# Altium footprint library u025Library.PcbLib: 144 footprints (part 3 of 9)
Each footprint in its own frame and in the unit in brackets; x right, y up, seen from the top. Pads: shape width x height; smd on the part's side, far side on the other; paste and mask are expansions set on the pad; w line width, h text height; cw(c..) or ccw(c..) is an arc to the next point about the centre after c.
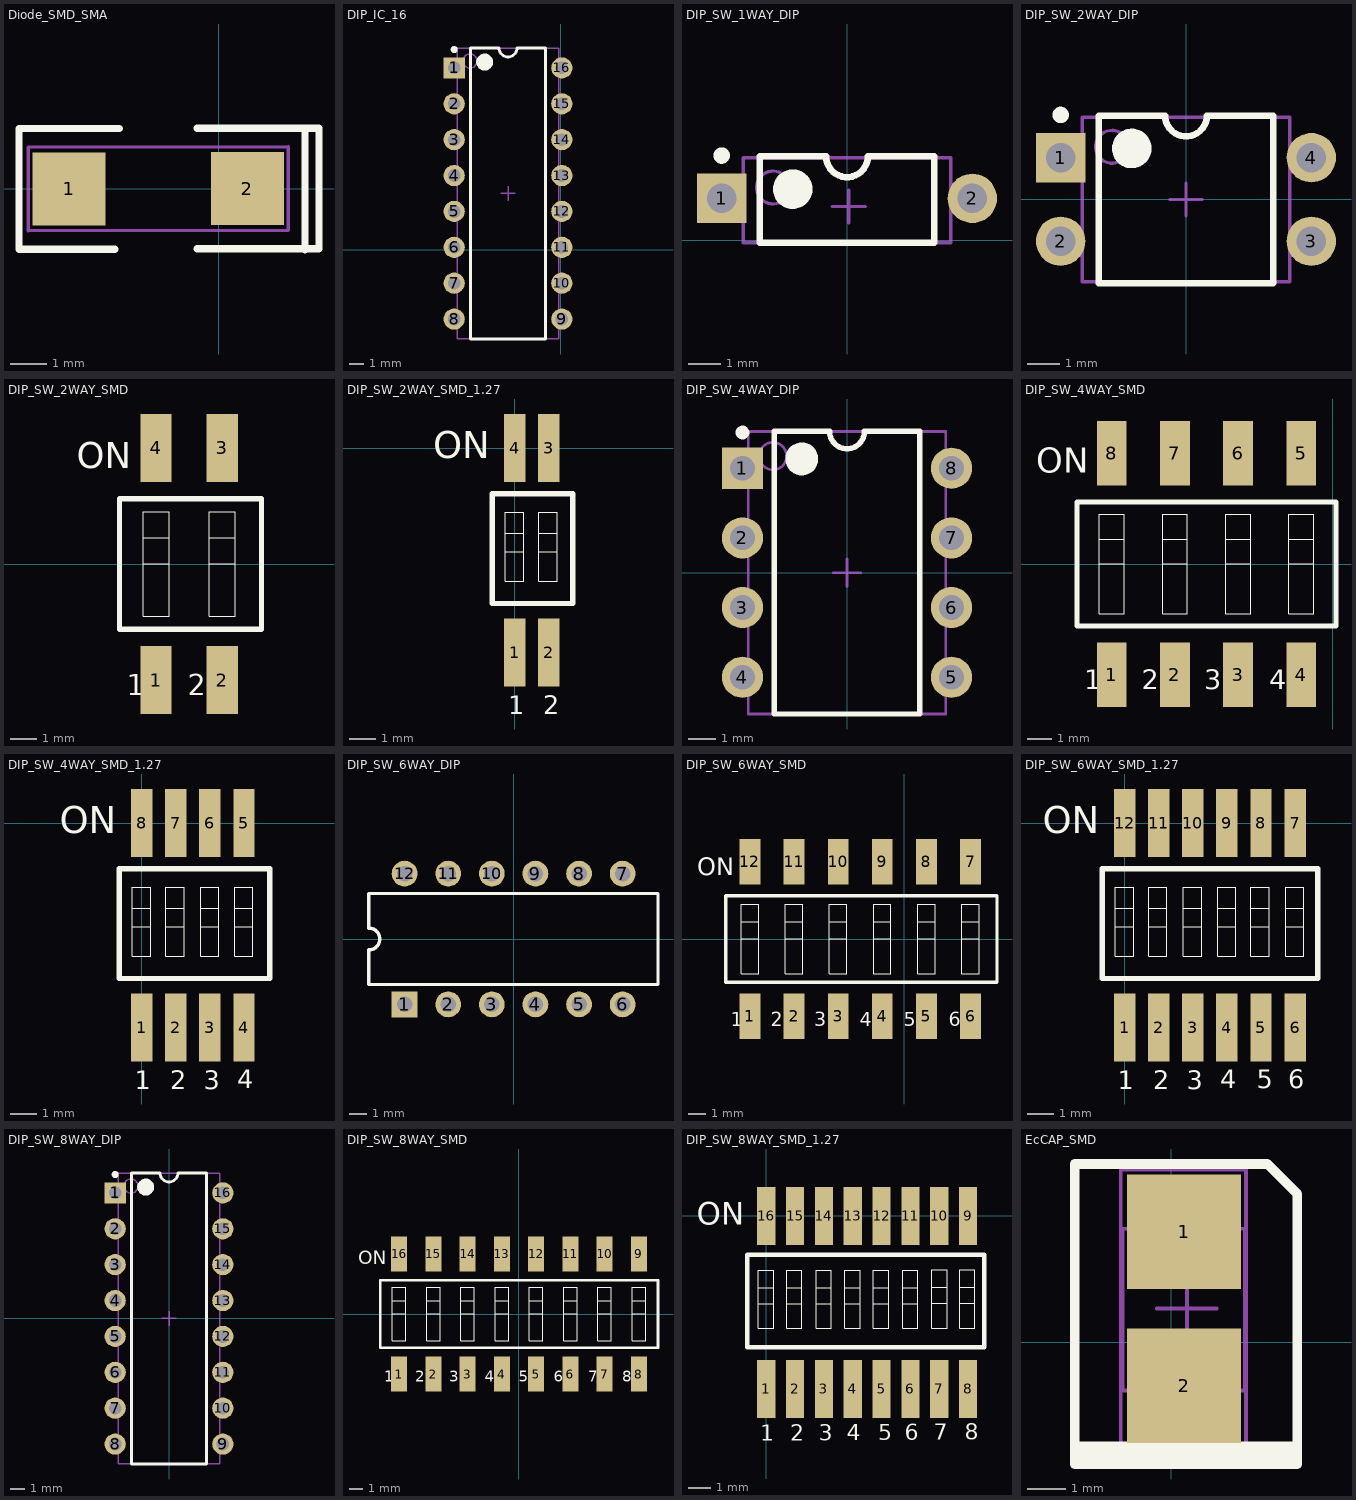
[diagram p2: the footprints below, top view; thin cyan lines are the x and y axes]

## Diode_SMD_SMA [mm] "Diode_SMD_SMA"
height 2.3
pads (2):
  rect 2x2 smd: 1(-4.09,0) 2(0.788,0.011)
Top Overlay:
  lines w0.2: -2.845,-1.651 -5.461,-1.651 -5.461,1.651 -2.718,1.651 ; -0.583,-1.64 2.744,-1.64 2.744,1.662 -0.583,1.662 ; 2.363,-1.666 2.363,1.636
Mechanical 15:
  lines w0.1: -5.207,-1.144 1.906,-1.132 1.906,1.154 -5.207,1.142 ; -5.207,-1.143 -5.207,1.143
3D body: height 2.5, standoff 0.1, extent -4.276,-1.275 0.924,1.325

## DIP_IC_16 [mm]
pads (16):
  rect 1.5x1.5 hole 0.9: 1(-7.552,12.876)
  round 1.5 hole 0.9: 2(-7.552,10.336) 3(-7.552,7.796) 4(-7.552,5.256) 5(-7.552,2.716) 6(-7.552,0.176) 7(-7.552,-2.364) 8(-7.552,-4.904) 9(0.068,-4.904) 10(0.068,-2.364) 11(0.068,0.176) 12(0.068,2.716) 13(0.068,5.256) 14(0.068,7.796) 15(0.068,10.336) 16(0.068,12.876)
Top Overlay:
  circle w0.6: c-5.392,13.286 r0.3
  circle w0.25: c-7.552,14.176 r0.125
  lines w0.2: -6.392,-6.314 -1.092,-6.314 -1.092,14.286 -3.107,14.286 cw(c-3.742,14.286) -4.377,14.286 -6.392,14.286 -6.392,-6.314
Mechanical 13:
  circle w0.1: c-6.442,13.361 r0.5
  lines w0.1: -7.342,-6.289 -0.142,-6.289 -0.142,14.261 -7.342,14.261 -7.342,-6.289
Mechanical 15:
  lines w0.1: -4.242,3.986 -3.242,3.986 ; -3.742,3.486 -3.742,4.486
3D body: height 3.3, standoff -0.9, extent -7.45,-6.199 0.17,14.121

## DIP_SW_1WAY_DIP [mm] "DIP; 2 Leads; Row Spacing 7.62 mm; Pitch 2.54 mm"
height 5.6
pads (2):
  rect 1.5x1.5 hole 0.9: 1(-3.81,1.27)
  round 1.5 hole 0.9: 2(3.81,1.27)
Top Overlay:
  circle w0.25: c-3.81,2.57 r0.125
  circle w0.6: c-1.65,1.55 r0.3
  lines w0.2: -2.65,-0.076 -2.65,2.55 -0.635,2.55 ccw(c0,2.55) 0.635,2.55 2.65,2.55 2.65,-0.076 -2.65,-0.076
Mechanical 13:
  circle w0.1: c-2.25,1.6 r0.5
  lines w0.1: -3.15,-0.076 -3.15,2.5 3.15,2.5 3.15,-0.076 -3.15,-0.076
Mechanical 15:
  lines w0.1: -0.449,1.024 0.551,1.024 ; 0.051,0.524 0.051,1.524
3D body: height 3.1, standoff -4, extent -5.303,-0.445 5.202,3.035

## DIP_SW_2WAY_DIP [mm] "DIP; 4 Leads; Row Spacing 7.62 mm; Pitch 2.54 mm"
height 5.6
pads (4):
  rect 1.5x1.5 hole 0.9: 1(-3.81,1.27)
  round 1.5 hole 0.9: 2(-3.81,-1.27) 3(3.81,-1.27) 4(3.81,1.27)
Top Overlay:
  circle w0.25: c-3.81,2.57 r0.125
  circle w0.6: c-1.65,1.55 r0.3
  lines w0.2: -2.65,-2.55 -2.65,2.55 -0.635,2.55 ccw(c0,2.55) 0.635,2.55 2.65,2.55 2.65,-2.55 -2.65,-2.55
Mechanical 13:
  circle w0.1: c-2.25,1.6 r0.5
  lines w0.1: -3.15,-2.5 -3.15,2.5 3.15,2.5 3.15,-2.5 -3.15,-2.5
Mechanical 15:
  lines w0.1: -0.5,0 0.5,0 ; 0,-0.5 0,0.5
3D body: height 3.3, standoff -0.9, extent -3.759,-2.438 3.861,2.642

## DIP_SW_2WAY_SMD [mm] "DIP Switch; 4 Leads"
height 5.06
pads (4):
  rect 1.2x2.6 smd: 1(-8.89,-4.45) 2(-6.35,-4.45) 3(-6.35,4.45) 4(-8.89,4.45)
Top Overlay:
  lines w0.025: -9.39,0 -8.39,0 ; -9.39,1 -8.39,1 ; -6.85,0 -5.85,0 ; -6.85,1 -5.85,1 ; -9.39,-2 -9.39,2 -8.39,2 -8.39,-2 -9.39,-2 ; -6.85,-2 -6.85,2 -5.85,2 -5.85,-2 -6.85,-2
  lines w0.2: -10.29,-2.5 -10.29,2.5 -4.851,2.5 -4.851,-2.5 -10.29,-2.5
  text "2" at -7.681,-5.032 h0.8
  text "1" at -10.006,-5.032 h0.8
  text "ON" at -11.938,3.678 h1
3D body: height 6.05, standoff 0, extent -11.019,-4.953 -4.119,5.327

## DIP_SW_2WAY_SMD_1.27 [mm] "DIP Switch; 4 Leads"
height 5.06
pads (4):
  rect 0.8x2.54 smd: 1(0,-7.62) 2(1.27,-7.62) 3(1.27,0) 4(0,0)
Top Overlay:
  lines w0.025: -0.348,-3.861 0.33,-3.861 ; -0.348,-3.166 0.33,-3.166 ; 0.897,-3.861 1.575,-3.861 ; 0.897,-3.166 1.575,-3.166 ; -0.348,-4.953 -0.348,-2.388 0.33,-2.388 0.33,-4.953 -0.348,-4.953 ; 0.897,-4.953 0.897,-2.388 1.575,-2.388 1.575,-4.953 0.897,-4.953
  lines w0.2: -0.838,-5.791 2.159,-5.791 2.159,-1.702 -0.838,-1.702 -0.838,-5.791
  text "2" at 1.067,-9.906 h0.7
  text "ON" at -3.048,-0.381 h1
  text "1" at -0.254,-9.906 h0.7
3D body: height 1.5, standoff -0.05, extent -1.281,-7.033 2.489,-0.333

## DIP_SW_4WAY_DIP [mm] "DIP; 4 Leads; Row Spacing 7.62 mm; Pitch 2.54 mm"
height 5.08
pads (8):
  rect 1.5x1.5 hole 0.9: 1(-3.81,3.81)
  round 1.5 hole 0.9: 2(-3.81,1.27) 3(-3.81,-1.27) 4(-3.81,-3.81) 5(3.81,-3.81) 6(3.81,-1.27) 7(3.81,1.27) 8(3.81,3.81)
Top Overlay:
  circle w0.25: c-3.81,5.11 r0.125
  circle w0.6: c-1.65,4.15 r0.3
  lines w0.2: -2.65,-5.15 -2.65,5.15 -0.635,5.15 ccw(c0,5.15) 0.635,5.15 2.65,5.15 2.65,-5.15 -2.65,-5.15
Mechanical 13:
  circle w0.1: c-2.7,4.25 r0.5
  lines w0.1: -3.6,-5.15 -3.6,5.15 3.6,5.15 3.6,-5.15 -3.6,-5.15
Mechanical 15:
  lines w0.1: -0.5,0 0.5,0 ; 0,-0.5 0,0.5
3D body: height 3.3, standoff -0.9, extent -3.886,-5.029 3.734,5.131

## DIP_SW_4WAY_SMD [mm] "DIP Switch; 8 Leads"
height 5.06
pads (8):
  rect 1.2x2.6 smd: 1(-8.89,-4.45) 2(-6.35,-4.45) 3(-3.81,-4.45) 4(-1.27,-4.45) 5(-1.27,4.45) 6(-3.81,4.45) 7(-6.35,4.45) 8(-8.89,4.45)
Top Overlay:
  lines w0.025: -9.39,0 -8.39,0 ; -9.39,1 -8.39,1 ; -6.85,0 -5.85,0 ; -6.85,1 -5.85,1 ; -4.31,0 -3.31,0 ; -4.31,1 -3.31,1 ; -1.77,0 -0.77,0 ; -1.77,1 -0.77,1 ; -9.39,-2 -9.39,2 -8.39,2 -8.39,-2 -9.39,-2 ; -6.85,-2 -6.85,2 -5.85,2 -5.85,-2 -6.85,-2 ; -4.31,-2 -4.31,2 -3.31,2 -3.31,-2 -4.31,-2 ; -1.77,-2 -1.77,2 -0.77,2 -0.77,-2 -1.77,-2
  lines w0.2: -10.29,-2.5 -10.29,2.5 0.127,2.5 0.127,-2.5 -10.29,-2.5
  text "4" at -2.556,-5.032 h0.8
  text "3" at -5.181,-5.032 h0.8
  text "2" at -7.681,-5.032 h0.8
  text "1" at -10.006,-5.032 h0.8
  text "ON" at -11.938,3.678 h1
3D body: height 4.32, standoff 0.05, extent -10.793,-4.955 0.837,4.955

## DIP_SW_4WAY_SMD_1.27 [mm] "DIP Switch; 8 Leads"
height 5.06
pads (8):
  rect 0.8x2.54 smd: 1(0,-7.62) 2(1.27,-7.62) 3(2.54,-7.62) 4(3.81,-7.62) 5(3.81,0) 6(2.54,0) 7(1.27,0) 8(0,0)
Top Overlay:
  lines w0.025: -0.348,-3.861 0.33,-3.861 ; -0.348,-3.166 0.33,-3.166 ; 0.897,-3.861 1.575,-3.861 ; 0.897,-3.166 1.575,-3.166 ; 2.192,-3.861 2.87,-3.861 ; 2.192,-3.166 2.87,-3.166 ; 3.462,-3.861 4.14,-3.861 ; 3.462,-3.166 4.14,-3.166 ; -0.348,-4.953 0.33,-4.953 0.33,-2.388 -0.348,-2.388 -0.348,-4.953 ; 0.897,-4.953 1.575,-4.953 1.575,-2.388 0.897,-2.388 0.897,-4.953 ; 2.192,-4.953 2.87,-4.953 2.87,-2.388 2.192,-2.388 2.192,-4.953 ; 3.462,-4.953 3.462,-2.388 4.14,-2.388 4.14,-4.953 3.462,-4.953
  lines w0.2: -0.838,-5.791 -0.838,-1.702 4.775,-1.702 4.775,-5.791 -0.838,-5.791
  text "1" at -0.254,-9.906 h0.7
  text "ON" at -3.048,-0.381 h1
  text "2" at 1.067,-9.906 h0.7
  text "3" at 2.311,-9.906 h0.7
  text "4" at 3.556,-9.881 h0.7
3D body: height 2.35, standoff 0, extent -1.124,-7.8 5.086,0.333

## DIP_SW_6WAY_DIP [mm] "DIP; 12 Leads; Row Spacing 7.62 mm; Pitch 2.54 mm"
height 5.8
pads (12):
  rect 1.5x1.5 hole 0.9: 1(-6.35,-3.81)
  round 1.5 hole 0.9: 2(-3.81,-3.81) 3(-1.27,-3.81) 4(1.27,-3.81) 5(3.81,-3.81) 6(6.35,-3.81) 7(6.35,3.81) 8(3.81,3.81) 9(1.27,3.81) 10(-1.27,3.81) 11(-3.81,3.81) 12(-6.35,3.81)
Top Overlay:
  lines w0.2: -8.43,-2.65 8.41,-2.65 8.41,2.65 -8.43,2.65 -8.43,0.635 cw(c-8.43,0) -8.43,-0.635 -8.43,-2.65
3D body: height 3.3, standoff -0.9, extent -7.569,-3.785 7.671,3.835

## DIP_SW_6WAY_SMD [mm] "DIP Switch; 12 Leads"
height 5.06
pads (12):
  rect 1.2x2.6 smd: 1(-8.89,-4.45) 2(-6.35,-4.45) 3(-3.81,-4.45) 4(-1.27,-4.45) 5(1.27,-4.45) 6(3.81,-4.45) 7(3.81,4.45) 8(1.27,4.45) 9(-1.27,4.45) 10(-3.81,4.45) 11(-6.35,4.45) 12(-8.89,4.45)
Top Overlay:
  lines w0.025: -9.39,0 -8.39,0 ; -9.39,1 -8.39,1 ; -6.85,0 -5.85,0 ; -6.85,1 -5.85,1 ; -4.31,0 -3.31,0 ; -4.31,1 -3.31,1 ; -1.77,0 -0.77,0 ; -1.77,1 -0.77,1 ; 0.77,0 1.77,0 ; 0.77,1 1.77,1 ; 3.31,0 4.31,0 ; 3.31,1 4.31,1 ; -9.39,-2 -9.39,2 -8.39,2 -8.39,-2 -9.39,-2 ; -6.85,-2 -6.85,2 -5.85,2 -5.85,-2 -6.85,-2 ; -4.31,-2 -4.31,2 -3.31,2 -3.31,-2 -4.31,-2 ; -1.77,-2 -1.77,2 -0.77,2 -0.77,-2 -1.77,-2 ; 0.77,-2 0.77,2 1.77,2 1.77,-2 0.77,-2 ; 3.31,-2 3.31,2 4.31,2 4.31,-2 3.31,-2
  lines w0.2: -10.29,-2.5 -10.29,2.5 5.334,2.5 5.334,-2.5 -10.29,-2.5
  text "6" at 2.569,-5.032 h0.8
  text "5" at -0.031,-5.032 h0.8
  text "4" at -2.556,-5.032 h0.8
  text "3" at -5.181,-5.032 h0.8
  text "2" at -7.681,-5.032 h0.8
  text "1" at -10.006,-5.032 h0.8
  text "ON" at -11.938,3.678 h1
3D body: height 4.3, standoff 0.1, extent -10.185,-3.734 5.055,3.886

## DIP_SW_6WAY_SMD_1.27 [mm] "DIP Switch; 12 Leads"
height 5.06
pads (12):
  rect 0.8x2.54 smd: 1(0,-7.62) 2(1.27,-7.62) 3(2.54,-7.62) 4(3.81,-7.62) 5(5.08,-7.62) 6(6.35,-7.62) 7(6.35,0) 8(5.08,0) 9(3.81,0) 10(2.54,0) 11(1.27,0) 12(0,0)
Top Overlay:
  lines w0.025: -0.348,-3.861 0.33,-3.861 ; -0.348,-3.166 0.33,-3.166 ; 0.897,-3.861 1.575,-3.861 ; 0.897,-3.166 1.575,-3.166 ; 2.192,-3.861 2.87,-3.861 ; 2.192,-3.166 2.87,-3.166 ; 3.462,-3.861 4.14,-3.861 ; 3.462,-3.166 4.14,-3.166 ; 4.707,-3.861 5.385,-3.861 ; 4.707,-3.166 5.385,-3.166 ; 6.002,-3.861 6.68,-3.861 ; 6.002,-3.166 6.68,-3.166 ; -0.348,-4.953 0.33,-4.953 0.33,-2.388 -0.348,-2.388 -0.348,-4.953 ; 0.897,-4.953 1.575,-4.953 1.575,-2.388 0.897,-2.388 0.897,-4.953 ; 2.192,-4.953 2.87,-4.953 2.87,-2.388 2.192,-2.388 2.192,-4.953 ; 3.462,-4.953 3.462,-2.388 4.14,-2.388 4.14,-4.953 3.462,-4.953 ; 4.707,-4.953 4.707,-2.388 5.385,-2.388 5.385,-4.953 4.707,-4.953 ; 6.002,-4.953 6.002,-2.388 6.68,-2.388 6.68,-4.953 6.002,-4.953
  lines w0.2: -0.838,-5.791 -0.838,-1.702 7.188,-1.702 7.188,-5.791 -0.838,-5.791
  text "1" at -0.254,-9.906 h0.7
  text "ON" at -3.048,-0.381 h1
  text "2" at 1.067,-9.906 h0.7
  text "3" at 2.311,-9.906 h0.7
  text "4" at 3.556,-9.881 h0.7
  text "6" at 6.096,-9.881 h0.7
  text "5" at 4.928,-9.881 h0.7
3D body: height 2.35, standoff 0, extent -1.175,-7.749 7.575,0.383

## DIP_SW_8WAY_DIP [mm] "DIP; 16 Leads; Row Spacing 7.62 mm; Pitch 2.54 mm"
height 5.08
pads (16):
  rect 1.5x1.5 hole 0.9: 1(-3.81,8.89)
  round 1.5 hole 0.9: 2(-3.81,6.35) 3(-3.81,3.81) 4(-3.81,1.27) 5(-3.81,-1.27) 6(-3.81,-3.81) 7(-3.81,-6.35) 8(-3.81,-8.89) 9(3.81,-8.89) 10(3.81,-6.35) 11(3.81,-3.81) 12(3.81,-1.27) 13(3.81,1.27) 14(3.81,3.81) 15(3.81,6.35) 16(3.81,8.89)
Top Overlay:
  circle w0.25: c-3.81,10.19 r0.125
  circle w0.6: c-1.65,9.3 r0.3
  lines w0.2: -2.65,-10.3 -2.65,10.3 -0.635,10.3 ccw(c0,10.3) 0.635,10.3 2.65,10.3 2.65,-10.3 -2.65,-10.3
Mechanical 13:
  circle w0.1: c-2.7,9.375 r0.5
  lines w0.1: -3.6,-10.275 -3.6,10.275 3.6,10.275 3.6,-10.275 -3.6,-10.275
Mechanical 15:
  lines w0.1: -0.5,0 0.5,0 ; 0,-0.5 0,0.5
3D body: height 3.3, standoff -0.9, extent -3.708,-10.185 3.912,10.135

## DIP_SW_8WAY_SMD [mm] "DIP Switch; 16 Leads"
height 5.06
pads (16):
  rect 1.2x2.6 smd: 1(-8.89,-4.45) 2(-6.35,-4.45) 3(-3.81,-4.45) 4(-1.27,-4.45) 5(1.27,-4.45) 6(3.81,-4.45) 7(6.35,-4.45) 8(8.89,-4.45) 9(8.89,4.45) 10(6.35,4.45) 11(3.81,4.45) 12(1.27,4.45) 13(-1.27,4.45) 14(-3.81,4.45) 15(-6.35,4.45) 16(-8.89,4.45)
Top Overlay:
  lines w0.025: -9.39,0 -8.39,0 ; -9.39,1 -8.39,1 ; -6.85,0 -5.85,0 ; -6.85,1 -5.85,1 ; -4.31,0 -3.31,0 ; -4.31,1 -3.31,1 ; -1.77,0 -0.77,0 ; -1.77,1 -0.77,1 ; 0.77,0 1.77,0 ; 0.77,1 1.77,1 ; 3.31,0 4.31,0 ; 3.31,1 4.31,1 ; 5.85,0 6.85,0 ; 5.85,1 6.85,1 ; 8.39,0 9.39,0 ; 8.39,1 9.39,1 ; -9.39,-2 -8.39,-2 -8.39,2 -9.39,2 -9.39,-2 ; -6.85,-2 -5.85,-2 -5.85,2 -6.85,2 -6.85,-2 ; -4.31,-2 -3.31,-2 -3.31,2 -4.31,2 -4.31,-2 ; -1.77,-2 -0.77,-2 -0.77,2 -1.77,2 -1.77,-2 ; 0.77,-2 1.77,-2 1.77,2 0.77,2 0.77,-2 ; 3.31,-2 4.31,-2 4.31,2 3.31,2 3.31,-2 ; 5.85,-2 6.85,-2 6.85,2 5.85,2 5.85,-2 ; 8.39,-2 9.39,-2 9.39,2 8.39,2 8.39,-2
  lines w0.2: -10.29,-2.5 10.31,-2.5 10.31,2.5 -10.29,2.5 -10.29,-2.5
  text "8" at 7.659,-5.032 h0.8
  text "7" at 5.119,-5.032 h0.8
  text "ON" at -11.938,3.678 h1
  text "1" at -10.006,-5.032 h0.8
  text "2" at -7.681,-5.032 h0.8
  text "3" at -5.181,-5.032 h0.8
  text "4" at -2.556,-5.032 h0.8
  text "5" at -0.031,-5.032 h0.8
  text "6" at 2.569,-5.032 h0.8
3D body: height 4.3, standoff 0.1, extent -10.185,-4.091 10.135,3.529

## DIP_SW_8WAY_SMD_1.27 [mm] "DIP Switch; 16 Leads"
height 5.06
pads (16):
  rect 0.8x2.54 smd: 1(0,-7.62) 2(1.27,-7.62) 3(2.54,-7.62) 4(3.81,-7.62) 5(5.08,-7.62) 6(6.35,-7.62) 7(7.62,-7.62) 8(8.89,-7.62) 9(8.89,0) 10(7.62,0) 11(6.35,0) 12(5.08,0) 13(3.81,0) 14(2.54,0) 15(1.27,0) 16(0,0)
Top Overlay:
  lines w0.025: -0.348,-3.861 0.33,-3.861 ; -0.348,-3.166 0.33,-3.166 ; 0.897,-3.861 1.575,-3.861 ; 0.897,-3.166 1.575,-3.166 ; 2.192,-3.861 2.87,-3.861 ; 2.192,-3.166 2.87,-3.166 ; 3.462,-3.861 4.14,-3.861 ; 3.462,-3.166 4.14,-3.166 ; 4.707,-3.861 5.385,-3.861 ; 4.707,-3.166 5.385,-3.166 ; 6.002,-3.861 6.68,-3.861 ; 6.002,-3.166 6.68,-3.166 ; 7.29,-3.845 7.968,-3.845 ; 7.29,-3.15 7.968,-3.15 ; 8.509,-3.845 9.187,-3.845 ; 8.509,-3.15 9.187,-3.15 ; -0.348,-4.953 0.33,-4.953 0.33,-2.388 -0.348,-2.388 -0.348,-4.953 ; 0.897,-4.953 1.575,-4.953 1.575,-2.388 0.897,-2.388 0.897,-4.953 ; 2.192,-4.953 2.87,-4.953 2.87,-2.388 2.192,-2.388 2.192,-4.953 ; 3.462,-4.953 3.462,-2.388 4.14,-2.388 4.14,-4.953 3.462,-4.953 ; 4.707,-4.953 4.707,-2.388 5.385,-2.388 5.385,-4.953 4.707,-4.953 ; 6.002,-4.953 6.002,-2.388 6.68,-2.388 6.68,-4.953 6.002,-4.953 ; 7.29,-4.937 7.968,-4.937 7.968,-2.372 7.29,-2.372 7.29,-4.937 ; 8.509,-4.937 8.509,-2.372 9.187,-2.372 9.187,-4.937 8.509,-4.937
  lines w0.2: -0.838,-5.791 -0.838,-1.702 9.601,-1.702 9.601,-5.791 -0.838,-5.791
  text "1" at -0.254,-9.906 h0.7
  text "ON" at -3.048,-0.381 h1
  text "2" at 1.067,-9.906 h0.7
  text "3" at 2.311,-9.906 h0.7
  text "4" at 3.556,-9.881 h0.7
  text "8" at 8.738,-9.855 h0.7
  text "7" at 7.366,-9.855 h0.7
  text "6" at 6.096,-9.881 h0.7
  text "5" at 4.928,-9.881 h0.7
3D body: height 2.4, standoff 0, extent -1.179,-7.961 10.121,0.239

## EcCAP_SMD [mm] "EcCAP SMD 4x5x5mm"
height 5
pads (2):
  rect 3x3 smd: 1(0.33,2.896) 2(0.33,-1.143)
Top Overlay:
  lines w0.254: 3.099,-2.896 2.921,-2.896 ; 3.15,-3.048 2.769,-3.048 ; 3.251,-2.743 2.921,-2.743 -2.464,-2.743 -2.311,-2.896 2.921,-2.896 ; -2.54,-3.2 -2.388,-3.048 2.769,-3.048 ; -2.54,-3.2 3.302,-3.2 3.302,3.886 2.515,4.674 -2.54,4.674 -2.54,-3.2 ; 2.769,-3.048 2.921,-2.896
Mechanical 13:
  lines w0.1: -1.288,-1.27 -1.288,2.972 1.93,2.972 1.93,-1.27 -1.288,-1.27
Mechanical 15:
  lines w0.1: -0.388,0.878 1.181,0.878 ; 0.406,-0.15 0.406,1.93 ; -1.333,-2.769 -1.333,4.521 1.956,4.521 1.956,-2.769 -1.333,-2.769
3D body: height 5.52, standoff -0.4, extent -2.337,-2.261 2.997,3.835